# Altium footprint library TYCO THD.PcbLib: 146 footprints (part 4 of 11) (continued)
## TYCO_3-794630-8 [mm] "8 Circuits Dual-Row - Vertical Micro MATE-N-LOK Connector"
height 9.24
pads (8):
  round 1.8 hole 1.1: 1(4.5,-1.5) 2(1.5,-1.5) 3(-1.5,-1.5) 4(-4.5,-1.5) 5(4.5,1.5) 6(1.5,1.5) 7(-1.5,1.5) 8(-4.5,1.5)
Top Overlay:
  lines w0.2: -6.86,-1 -6.43,-1 ; -6.86,1 -6.43,1 ; -4.25,-3.43 cw(c-4.25,-3.63) -4.05,-3.63 -4.05,-3.94 -2.8,-3.94 -2.8,-3.63 cw(c-2.6,-3.63) -2.6,-3.43 ; -1.3,3.43 ccw(c-1.3,4.03) -0.7,4.03 -0.7,4.082 ; 1.3,3.43 cw(c1.3,4.03) 0.7,4.03 0.7,4.082 ; 2.6,-3.43 cw(c2.6,-3.63) 2.8,-3.63 2.8,-3.94 4.05,-3.94 4.05,-3.63 cw(c4.25,-3.63) 4.25,-3.43 ; 6.43,-1 6.86,-1 ; 6.43,1 6.86,1 ; -7.55,-1.5 -6.86,-1.5 -6.86,1.5 -7.55,1.5 ; -7.55,-1.5 -8,-0.72 -8,0.72 -7.55,1.5 ; -7.55,-1.5 -7.55,1.5 ; -0.7,4.082 -0.7,4.73 0.7,4.73 0.7,4.082 ; -0.7,4.082 0.7,4.082 ; 7.55,-1.5 6.86,-1.5 6.86,1.5 7.55,1.5 ; 7.55,-1.5 7.55,1.5 ; 7.55,-1.5 8,-0.72 8,0.72 7.55,1.5 ; -6.43,-3.43 -6.43,3.43 6.43,3.43 6.43,-3.43 -6.43,-3.43 ; -5.81,-2.81 -3.89,-2.81 -3.19,-2.11 -3.19,-0.19 -5.81,-0.19 -5.81,-2.81 ; -5.81,0.19 -3.19,0.19 -3.19,2.81 -5.81,2.81 -5.81,0.19 ; -2.81,-2.11 -2.81,-0.19 -0.19,-0.19 -0.19,-2.81 -2.11,-2.81 -2.81,-2.11 ; -2.81,0.89 -2.81,2.81 -0.19,2.81 -0.19,0.19 -2.11,0.19 -2.81,0.89 ; 0.19,-2.81 2.11,-2.81 2.81,-2.11 2.81,-0.19 0.19,-0.19 0.19,-2.81 ; 0.19,0.19 2.11,0.19 2.81,0.89 2.81,2.81 0.19,2.81 0.19,0.19 ; 3.19,-2.11 3.19,-0.19 5.81,-0.19 5.81,-2.81 3.89,-2.81 3.19,-2.11 ; 3.19,0.89 3.19,2.81 5.81,2.81 5.81,0.19 3.89,0.19 3.19,0.89
  text "3" at -0.889,-4.87 h1.2
  text "2" at 2.032,-4.87 h1.2
  text "7" at -1.448,4.01 h1.2
  text "6" at 2.487,4.01 h1.2
  text "5" at 4.902,4.064 h1.2
  text "8" at -4.064,4.035 h1.2
  text "4" at -4.445,-4.87 h1.2
  text "1" at 5.588,-4.67 h1.2
Mechanical 8:
  lines w0.1: -5.5,-1.5 -4.5,-1.5 ; -5.5,1.5 -4.5,1.5 ; -4.5,-2.5 -4.5,-1.5 ; -4.5,-0.5 -4.5,-1.5 ; -4.5,0.5 -4.5,1.5 ; -4.5,2.5 -4.5,1.5 ; -3.5,-1.5 -4.5,-1.5 ; -3.5,1.5 -4.5,1.5 ; -2.5,-1.5 -1.5,-1.5 ; -2.5,1.5 -1.5,1.5 ; -1.5,-2.5 -1.5,-1.5 ; -1.5,-0.5 -1.5,-1.5 ; -1.5,0.5 -1.5,1.5 ; -1.5,2.5 -1.5,1.5 ; -1,0 0,0 ; -0.5,-1.5 -1.5,-1.5 ; -0.5,1.5 -1.5,1.5 ; 0,-1 0,0 ; 0,1 0,0 ; 0.5,-1.5 1.5,-1.5 ; 0.5,1.5 1.5,1.5 ; 1,0 0,0 ; 1.5,-2.5 1.5,-1.5 ; 1.5,-0.5 1.5,-1.5 ; 1.5,0.5 1.5,1.5 ; 1.5,2.5 1.5,1.5 ; 2.5,-1.5 1.5,-1.5 ; 2.5,1.5 1.5,1.5 ; 3.5,-1.5 4.5,-1.5 ; 3.5,1.5 4.5,1.5 ; 4.5,-2.5 4.5,-1.5 ; 4.5,-0.5 4.5,-1.5 ; 4.5,0.5 4.5,1.5 ; 4.5,2.5 4.5,1.5 ; 5.5,-1.5 4.5,-1.5 ; 5.5,1.5 4.5,1.5
Mechanical 14:
  lines w0.1: -6.86,-1 -6.43,-1 ; -6.86,1 -6.43,1 ; -4.25,-3.43 cw(c-4.25,-3.63) -4.05,-3.63 -4.05,-3.94 -2.8,-3.94 -2.8,-3.63 cw(c-2.6,-3.63) -2.6,-3.43 ; -1.3,3.43 ccw(c-1.3,4.03) -0.7,4.03 -0.7,4.082 ; 1.3,3.43 cw(c1.3,4.03) 0.7,4.03 0.7,4.082 ; 2.6,-3.43 cw(c2.6,-3.63) 2.8,-3.63 2.8,-3.94 4.05,-3.94 4.05,-3.63 cw(c4.25,-3.63) 4.25,-3.43 ; 6.43,-1 6.86,-1 ; 6.43,1 6.86,1 ; -7.55,-1.5 -6.86,-1.5 -6.86,1.5 -7.55,1.5 ; -7.55,-1.5 -8,-0.72 -8,0.72 -7.55,1.5 ; -7.55,-1.5 -7.55,1.5 ; -0.7,4.082 -0.7,4.73 0.7,4.73 0.7,4.082 ; -0.7,4.082 0.7,4.082 ; 7.55,-1.5 6.86,-1.5 6.86,1.5 7.55,1.5 ; 7.55,-1.5 7.55,1.5 ; 7.55,-1.5 8,-0.72 8,0.72 7.55,1.5 ; -6.43,-3.43 -6.43,3.43 6.43,3.43 6.43,-3.43 -6.43,-3.43 ; -5.81,-2.81 -3.89,-2.81 -3.19,-2.11 -3.19,-0.19 -5.81,-0.19 -5.81,-2.81 ; -5.81,0.19 -3.19,0.19 -3.19,2.81 -5.81,2.81 -5.81,0.19 ; -2.81,-2.11 -2.81,-0.19 -0.19,-0.19 -0.19,-2.81 -2.11,-2.81 -2.81,-2.11 ; -2.81,0.89 -2.81,2.81 -0.19,2.81 -0.19,0.19 -2.11,0.19 -2.81,0.89 ; 0.19,-2.81 2.11,-2.81 2.81,-2.11 2.81,-0.19 0.19,-0.19 0.19,-2.81 ; 0.19,0.19 2.11,0.19 2.81,0.89 2.81,2.81 0.19,2.81 0.19,0.19 ; 3.19,-2.11 3.19,-0.19 5.81,-0.19 5.81,-2.81 3.89,-2.81 3.19,-2.11 ; 3.19,0.89 3.19,2.81 5.81,2.81 5.81,0.19 3.89,0.19 3.19,0.89
  text "3" at -0.889,-4.87 h1.2
  text "2" at 2.032,-4.87 h1.2
  text "7" at -1.448,4.01 h1.2
  text "6" at 2.487,4.01 h1.2
  text "5" at 4.902,4.064 h1.2
  text "8" at -4.064,4.035 h1.2
  text "4" at -4.445,-4.87 h1.2
  text "1" at 5.588,-4.67 h1.2
3D body "TYCO_3-794630-8.stp": height 9.24, standoff -3.18, extent -8,-3.94 8,4.73

## TYCO_3-794631-4 [mm] "4 Circuits Dual-Row - Vertical Micro MATE-N-LOK Connector - Gold Contact Plating"
height 9.24
pads (4):
  round 1.8 hole 1.1: 1(1.5,-1.5) 2(-1.5,-1.5) 3(1.5,1.5) 4(-1.5,1.5)
Top Overlay:
  lines w0.2: -3.86,-1 -3.43,-1 ; -3.86,1 -3.43,1 ; -1.9,-3.43 cw(c-1.9,-3.63) -1.7,-3.63 -1.7,-3.94 -0.45,-3.94 -0.45,-3.63 cw(c-0.25,-3.63) -0.25,-3.43 ; -1.3,3.43 ccw(c-1.3,4.03) -0.7,4.03 -0.7,4.082 ; 0.25,-3.43 cw(c0.25,-3.63) 0.45,-3.63 0.45,-3.94 1.7,-3.94 1.7,-3.63 cw(c1.9,-3.63) 1.9,-3.43 ; 1.3,3.43 cw(c1.3,4.03) 0.7,4.03 0.7,4.082 ; 3.43,-1 3.86,-1 ; 3.43,1 3.86,1 ; -4.55,-1.5 -4.55,1.5 ; -4.55,-1.5 -5,-0.72 -5,0.72 -4.55,1.5 ; -4.55,-1.5 -3.86,-1.5 -3.86,1.5 -4.55,1.5 ; -0.7,4.082 0.7,4.082 ; -0.7,4.082 -0.7,4.73 0.7,4.73 0.7,4.082 ; 4.55,-1.5 5,-0.72 5,0.72 4.55,1.5 ; 4.55,-1.5 4.55,1.5 ; 4.55,-1.5 3.86,-1.5 3.86,1.5 4.55,1.5 ; -3.43,-3.43 3.43,-3.43 3.43,3.43 -3.43,3.43 -3.43,-3.43 ; -2.81,-2.11 -2.11,-2.81 -0.19,-2.81 -0.19,-0.19 -2.81,-0.19 -2.81,-2.11 ; -2.81,0.19 -2.81,2.81 -0.19,2.81 -0.19,0.89 -0.89,0.19 -2.81,0.19 ; 0.19,-2.81 0.19,-0.19 2.81,-0.19 2.81,-2.11 2.11,-2.81 0.19,-2.81 ; 0.19,0.89 0.89,0.19 2.81,0.19 2.81,2.81 0.19,2.81 0.19,0.89
  text "1" at 3.373,-4.345 h1.2
  text "2" at -2.157,-4.72 h1.2
  text "4" at -1.725,3.934 h1.2
  text "3" at 2.893,4.012 h1.2
Mechanical 8:
  lines w0.1: -2.5,-1.5 -1.5,-1.5 ; -2.5,1.5 -1.5,1.5 ; -1.5,-2.5 -1.5,-1.5 ; -1.5,-0.5 -1.5,-1.5 ; -1.5,0.5 -1.5,1.5 ; -1.5,2.5 -1.5,1.5 ; -1,0 0,0 ; -0.5,-1.5 -1.5,-1.5 ; -0.5,1.5 -1.5,1.5 ; 0,-1 0,0 ; 0,1 0,0 ; 0.5,-1.5 1.5,-1.5 ; 0.5,1.5 1.5,1.5 ; 1,0 0,0 ; 1.5,-2.5 1.5,-1.5 ; 1.5,-0.5 1.5,-1.5 ; 1.5,0.5 1.5,1.5 ; 1.5,2.5 1.5,1.5 ; 2.5,-1.5 1.5,-1.5 ; 2.5,1.5 1.5,1.5
Mechanical 14:
  lines w0.1: -3.86,-1 -3.43,-1 ; -3.86,1 -3.43,1 ; -1.9,-3.43 cw(c-1.9,-3.63) -1.7,-3.63 -1.7,-3.94 -0.45,-3.94 -0.45,-3.63 cw(c-0.25,-3.63) -0.25,-3.43 ; -1.3,3.43 ccw(c-1.3,4.03) -0.7,4.03 -0.7,4.082 ; 0.25,-3.43 cw(c0.25,-3.63) 0.45,-3.63 0.45,-3.94 1.7,-3.94 1.7,-3.63 cw(c1.9,-3.63) 1.9,-3.43 ; 1.3,3.43 cw(c1.3,4.03) 0.7,4.03 0.7,4.082 ; 3.43,-1 3.86,-1 ; 3.43,1 3.86,1 ; -4.55,-1.5 -4.55,1.5 ; -4.55,-1.5 -5,-0.72 -5,0.72 -4.55,1.5 ; -4.55,-1.5 -3.86,-1.5 -3.86,1.5 -4.55,1.5 ; -0.7,4.082 0.7,4.082 ; -0.7,4.082 -0.7,4.73 0.7,4.73 0.7,4.082 ; 4.55,-1.5 5,-0.72 5,0.72 4.55,1.5 ; 4.55,-1.5 4.55,1.5 ; 4.55,-1.5 3.86,-1.5 3.86,1.5 4.55,1.5 ; -3.43,-3.43 3.43,-3.43 3.43,3.43 -3.43,3.43 -3.43,-3.43 ; -2.81,-2.11 -2.11,-2.81 -0.19,-2.81 -0.19,-0.19 -2.81,-0.19 -2.81,-2.11 ; -2.81,0.19 -2.81,2.81 -0.19,2.81 -0.19,0.89 -0.89,0.19 -2.81,0.19 ; 0.19,-2.81 0.19,-0.19 2.81,-0.19 2.81,-2.11 2.11,-2.81 0.19,-2.81 ; 0.19,0.89 0.89,0.19 2.81,0.19 2.81,2.81 0.19,2.81 0.19,0.89
  text "1" at 3.373,-4.345 h1.2
  text "2" at -2.157,-4.72 h1.2
  text "4" at -1.725,3.934 h1.2
  text "3" at 2.893,4.012 h1.2
3D body "TYCO_3-794631-4.stp": height 9.24, standoff -3.18, extent -5,-3.94 5,4.73

## TYCO_3-794631-8 [mm] "8 Circuits Dual-Row - Vertical Micro MATE-N-LOK Connector - Gold Contact Plating"
height 9.24
pads (8):
  round 1.8 hole 1.1: 1(4.5,-1.5) 2(1.5,-1.5) 3(-1.5,-1.5) 4(-4.5,-1.5) 5(4.5,1.5) 6(1.5,1.5) 7(-1.5,1.5) 8(-4.5,1.5)
Top Overlay:
  lines w0.2: -6.86,-1 -6.43,-1 ; -6.86,1 -6.43,1 ; -4.25,-3.43 cw(c-4.25,-3.63) -4.05,-3.63 -4.05,-3.94 -2.8,-3.94 -2.8,-3.63 cw(c-2.6,-3.63) -2.6,-3.43 ; -1.3,3.43 ccw(c-1.3,4.03) -0.7,4.03 -0.7,4.082 ; 1.3,3.43 cw(c1.3,4.03) 0.7,4.03 0.7,4.082 ; 2.6,-3.43 cw(c2.6,-3.63) 2.8,-3.63 2.8,-3.94 4.05,-3.94 4.05,-3.63 cw(c4.25,-3.63) 4.25,-3.43 ; 6.43,-1 6.86,-1 ; 6.43,1 6.86,1 ; -7.55,-1.5 -7.55,1.5 ; -7.55,-1.5 -8,-0.72 -8,0.72 -7.55,1.5 ; -7.55,-1.5 -6.86,-1.5 -6.86,1.5 -7.55,1.5 ; -0.7,4.082 0.7,4.082 ; -0.7,4.082 -0.7,4.73 0.7,4.73 0.7,4.082 ; 7.55,-1.5 8,-0.72 8,0.72 7.55,1.5 ; 7.55,-1.5 7.55,1.5 ; 7.55,-1.5 6.86,-1.5 6.86,1.5 7.55,1.5 ; -6.43,-3.43 6.43,-3.43 6.43,3.43 -6.43,3.43 -6.43,-3.43 ; -5.81,-2.81 -5.81,-0.19 -3.19,-0.19 -3.19,-2.11 -3.89,-2.81 -5.81,-2.81 ; -5.81,0.19 -5.81,2.81 -3.19,2.81 -3.19,0.19 -5.81,0.19 ; -2.81,-2.11 -2.11,-2.81 -0.19,-2.81 -0.19,-0.19 -2.81,-0.19 -2.81,-2.11 ; -2.81,0.89 -2.11,0.19 -0.19,0.19 -0.19,2.81 -2.81,2.81 -2.81,0.89 ; 0.19,-2.81 0.19,-0.19 2.81,-0.19 2.81,-2.11 2.11,-2.81 0.19,-2.81 ; 0.19,0.19 0.19,2.81 2.81,2.81 2.81,0.89 2.11,0.19 0.19,0.19 ; 3.19,-2.11 3.89,-2.81 5.81,-2.81 5.81,-0.19 3.19,-0.19 3.19,-2.11 ; 3.19,0.89 3.89,0.19 5.81,0.19 5.81,2.81 3.19,2.81 3.19,0.89
  text "1" at 5.588,-4.67 h1.2
  text "4" at -4.445,-4.87 h1.2
  text "8" at -4.064,4.01 h1.2
  text "5" at 4.902,4.039 h1.2
  text "6" at 2.362,3.985 h1.2
  text "7" at -1.448,3.985 h1.2
  text "2" at 2.032,-4.87 h1.2
  text "3" at -0.889,-4.87 h1.2
Mechanical 8:
  lines w0.1: -5.5,-1.5 -4.5,-1.5 ; -5.5,1.5 -4.5,1.5 ; -4.5,-2.5 -4.5,-1.5 ; -4.5,-0.5 -4.5,-1.5 ; -4.5,0.5 -4.5,1.5 ; -4.5,2.5 -4.5,1.5 ; -3.5,-1.5 -4.5,-1.5 ; -3.5,1.5 -4.5,1.5 ; -2.5,-1.5 -1.5,-1.5 ; -2.5,1.5 -1.5,1.5 ; -1.5,-2.5 -1.5,-1.5 ; -1.5,-0.5 -1.5,-1.5 ; -1.5,0.5 -1.5,1.5 ; -1.5,2.5 -1.5,1.5 ; -1,0 0,0 ; -0.5,-1.5 -1.5,-1.5 ; -0.5,1.5 -1.5,1.5 ; 0,-1 0,0 ; 0,1 0,0 ; 0.5,-1.5 1.5,-1.5 ; 0.5,1.5 1.5,1.5 ; 1,0 0,0 ; 1.5,-2.5 1.5,-1.5 ; 1.5,-0.5 1.5,-1.5 ; 1.5,0.5 1.5,1.5 ; 1.5,2.5 1.5,1.5 ; 2.5,-1.5 1.5,-1.5 ; 2.5,1.5 1.5,1.5 ; 3.5,-1.5 4.5,-1.5 ; 3.5,1.5 4.5,1.5 ; 4.5,-2.5 4.5,-1.5 ; 4.5,-0.5 4.5,-1.5 ; 4.5,0.5 4.5,1.5 ; 4.5,2.5 4.5,1.5 ; 5.5,-1.5 4.5,-1.5 ; 5.5,1.5 4.5,1.5
Mechanical 14:
  lines w0.1: -6.86,-1 -6.43,-1 ; -6.86,1 -6.43,1 ; -4.25,-3.43 cw(c-4.25,-3.63) -4.05,-3.63 -4.05,-3.94 -2.8,-3.94 -2.8,-3.63 cw(c-2.6,-3.63) -2.6,-3.43 ; -1.3,3.43 ccw(c-1.3,4.03) -0.7,4.03 -0.7,4.082 ; 1.3,3.43 cw(c1.3,4.03) 0.7,4.03 0.7,4.082 ; 2.6,-3.43 cw(c2.6,-3.63) 2.8,-3.63 2.8,-3.94 4.05,-3.94 4.05,-3.63 cw(c4.25,-3.63) 4.25,-3.43 ; 6.43,-1 6.86,-1 ; 6.43,1 6.86,1 ; -7.55,-1.5 -7.55,1.5 ; -7.55,-1.5 -8,-0.72 -8,0.72 -7.55,1.5 ; -7.55,-1.5 -6.86,-1.5 -6.86,1.5 -7.55,1.5 ; -0.7,4.082 0.7,4.082 ; -0.7,4.082 -0.7,4.73 0.7,4.73 0.7,4.082 ; 7.55,-1.5 8,-0.72 8,0.72 7.55,1.5 ; 7.55,-1.5 7.55,1.5 ; 7.55,-1.5 6.86,-1.5 6.86,1.5 7.55,1.5 ; -6.43,-3.43 6.43,-3.43 6.43,3.43 -6.43,3.43 -6.43,-3.43 ; -5.81,-2.81 -5.81,-0.19 -3.19,-0.19 -3.19,-2.11 -3.89,-2.81 -5.81,-2.81 ; -5.81,0.19 -5.81,2.81 -3.19,2.81 -3.19,0.19 -5.81,0.19 ; -2.81,-2.11 -2.11,-2.81 -0.19,-2.81 -0.19,-0.19 -2.81,-0.19 -2.81,-2.11 ; -2.81,0.89 -2.11,0.19 -0.19,0.19 -0.19,2.81 -2.81,2.81 -2.81,0.89 ; 0.19,-2.81 0.19,-0.19 2.81,-0.19 2.81,-2.11 2.11,-2.81 0.19,-2.81 ; 0.19,0.19 0.19,2.81 2.81,2.81 2.81,0.89 2.11,0.19 0.19,0.19 ; 3.19,-2.11 3.89,-2.81 5.81,-2.81 5.81,-0.19 3.19,-0.19 3.19,-2.11 ; 3.19,0.89 3.89,0.19 5.81,0.19 5.81,2.81 3.19,2.81 3.19,0.89
  text "1" at 5.588,-4.67 h1.2
  text "4" at -4.445,-4.87 h1.2
  text "8" at -4.064,4.01 h1.2
  text "5" at 4.902,4.039 h1.2
  text "6" at 2.362,3.985 h1.2
  text "7" at -1.448,3.985 h1.2
  text "2" at 2.032,-4.87 h1.2
  text "3" at -0.889,-4.87 h1.2
3D body "TYCO_3-794631-8.stp": height 9.24, standoff -3.18, extent -8,-3.94 8,4.73

## TYCO_3-1634221-2 [mm] "Straight D-SUB 37 Male Contacts for PCB  with Harpoons and Female Screwlock (UNC4-40)"
height 12.6
pads (39):
  round 1.6 hole 1: 1(-24.93,1.42) 2(-22.16,1.42) 3(-19.39,1.42) 4(-16.62,1.42) 5(-13.85,1.42) 6(-11.08,1.42) 7(-8.31,1.42) 8(-5.54,1.42) 9(-2.77,1.42) 10(0,1.42) 11(2.77,1.42) 12(5.54,1.42) 13(8.31,1.42) 14(11.08,1.42) 15(13.85,1.42) 16(16.62,1.42) 17(19.39,1.42) 18(22.16,1.42) 19(24.93,1.42) 20(-23.545,-1.42) 21(-20.775,-1.42) 22(-18.005,-1.42) 23(-15.235,-1.42) 24(-12.465,-1.42) 25(-9.695,-1.42) 26(-6.925,-1.42) 27(-4.155,-1.42) 28(-1.385,-1.42) 29(1.385,-1.42) 30(4.155,-1.42) 31(6.925,-1.42) 32(9.695,-1.42) 33(12.465,-1.42) 34(15.235,-1.42) 35(18.005,-1.42) 36(20.775,-1.42) 37(23.545,-1.42)
  round 5.5 hole 3.1: 38(31.755,0) 39(-31.755,0)
Top Overlay:
  circle w0.5: c24.93,7.42 r0.25
  lines w0.2: -34.7,-4.675 ccw(c-33.1,-4.675) -33.1,-6.275 33.1,-6.275 ccw(c33.1,-4.675) 34.7,-4.675 34.7,4.675 ccw(c33.1,4.675) 33.1,6.275 -33.1,6.275 ccw(c-33.1,4.675) -34.7,4.675 -34.7,-4.675 ; -27.776,0.946 cw(c-24.92,1.45) -24.92,4.35 24.92,4.35 cw(c24.92,1.45) 27.776,0.946 27.265,-1.954 cw(c24.409,-1.45) 24.409,-4.35 -24.409,-4.35 cw(c-24.409,-1.45) -27.265,-1.954 -27.776,0.946 ; -27.382,1.016 cw(c-24.92,1.45) -24.92,3.95 24.92,3.95 cw(c24.92,1.45) 27.382,1.016 26.871,-1.884 cw(c24.409,-1.45) 24.409,-3.95 -24.409,-3.95 cw(c-24.409,-1.45) -26.871,-1.884 -27.382,1.016
  text "37" at 26.059,-5.715 h1.2
  text "20" at -28.27,-5.842 h1.2
  text "1" at -27,4.318 h1.2
  text "19" at 26.543,4.318 h1.2
Mechanical 8:
  drawing of 160 lines, arcs and shapes, not listed
Mechanical 14:
  circle w0.1: c-22.16,1.42 r0.5
  circle w0.1: c-19.39,1.42 r0.5
  circle w0.1: c-16.62,1.42 r0.5
  circle w0.1: c-15.235,-1.42 r0.5
  circle w0.1: c-11.08,1.42 r0.5
  circle w0.1: c-9.695,-1.42 r0.5
  circle w0.1: c-5.54,1.42 r0.5
  circle w0.1: c-2.77,1.42 r0.5
  circle w0.1: c0,1.42 r0.5
  circle w0.1: c1.385,-1.42 r0.5
  circle w0.1: c5.54,1.42 r0.5
  circle w0.1: c11.08,1.42 r0.5
  circle w0.1: c16.62,1.42 r0.5
  circle w0.1: c22.16,1.42 r0.5
  circle w0.1: c6.925,-1.42 r0.5
  circle w0.1: c12.465,-1.42 r0.5
  circle w0.1: c18.005,-1.42 r0.5
  circle w0.1: c23.545,-1.42 r0.5
  circle w0.1: c20.775,-1.42 r0.5
  circle w0.1: c15.235,-1.42 r0.5
  circle w0.1: c9.695,-1.42 r0.5
  circle w0.1: c4.155,-1.42 r0.5
  circle w0.1: c19.39,1.42 r0.5
  circle w0.1: c13.85,1.42 r0.5
  circle w0.1: c8.31,1.42 r0.5
  circle w0.1: c2.77,1.42 r0.5
  circle w0.1: c-1.385,-1.42 r0.5
  circle w0.1: c-4.155,-1.42 r0.5
  circle w0.1: c-6.925,-1.42 r0.5
  circle w0.1: c-8.31,1.42 r0.5
  circle w0.1: c-12.465,-1.42 r0.5
  circle w0.1: c-13.85,1.42 r0.5
  circle w0.1: c-18.005,-1.42 r0.5
  circle w0.1: c-20.775,-1.42 r0.5
  circle w0.1: c-23.545,-1.42 r0.5
  circle w0.1: c-24.93,1.42 r0.5
  circle w0.1: c24.93,1.42 r0.5
  circle w0.1: c-31.755,0 r1.422
  circle w0.1: c31.755,0 r1.422
  lines w0.1: -34.7,-4.675 ccw(c-33.1,-4.675) -33.1,-6.275 33.1,-6.275 ccw(c33.1,-4.675) 34.7,-4.675 34.7,4.675 ccw(c33.1,4.675) 33.1,6.275 -33.1,6.275 ccw(c-33.1,4.675) -34.7,4.675 -34.7,-4.675 ; -34.497,0 -33.126,2.375 -30.384,2.375 -29.013,0 -30.384,-2.375 -33.126,-2.375 -34.497,0 ; -27.776,0.946 cw(c-24.92,1.45) -24.92,4.35 24.92,4.35 cw(c24.92,1.45) 27.776,0.946 27.265,-1.954 cw(c24.409,-1.45) 24.409,-4.35 -24.409,-4.35 cw(c-24.409,-1.45) -27.265,-1.954 -27.776,0.946 ; -27.382,1.016 cw(c-24.92,1.45) -24.92,3.95 24.92,3.95 cw(c24.92,1.45) 27.382,1.016 26.871,-1.884 cw(c24.409,-1.45) 24.409,-3.95 -24.409,-3.95 cw(c-24.409,-1.45) -26.871,-1.884 -27.382,1.016 ; 29.013,0 30.384,2.375 33.126,2.375 34.497,0 33.126,-2.375 30.384,-2.375 29.013,0
  text "37 D-Sub Male" at -8.128,4.572 h1.5
  text "37" at 26.059,-5.715 h1.5
  text "20" at -28.27,-5.842 h1.5
  text "1" at -27,4.318 h1.5
  text "19" at 26.543,4.318 h1.5
3D body "TYCO_3-1634221-2.stp": height 12.6, standoff -4.5, extent -34.7,-6.275 34.7,6.275

## TYCO_3-1634225-2 [mm] "Straight D-SUB 37 Female Contacts for PCB  with Harpoons and Female Screwlock (UNC4-40)"
height 12.15
pads (39):
  round 1.6 hole 1: 1(24.93,1.42) 2(22.16,1.42) 3(19.39,1.42) 4(16.62,1.42) 5(13.85,1.42) 6(11.08,1.42) 7(8.31,1.42) 8(5.54,1.42) 9(2.77,1.42) 10(0,1.42) 11(-2.77,1.42) 12(-5.54,1.42) 13(-8.31,1.42) 14(-11.08,1.42) 15(-13.85,1.42) 16(-16.62,1.42) 17(-19.39,1.42) 18(-22.16,1.42) 19(-24.93,1.42) 20(23.545,-1.42) 21(20.775,-1.42) 22(18.005,-1.42) 23(15.235,-1.42) 24(12.465,-1.42) 25(9.695,-1.42) 26(6.925,-1.42) 27(4.155,-1.42) 28(1.385,-1.42) 29(-1.385,-1.42) 30(-4.155,-1.42) 31(-6.925,-1.42) 32(-9.695,-1.42) 33(-12.465,-1.42) 34(-15.235,-1.42) 35(-18.005,-1.42) 36(-20.775,-1.42) 37(-23.545,-1.42)
  round 5.5 hole 3.1: 38(31.755,0) 39(-31.755,0)
Top Overlay:
  circle w0.5: c24.93,7.42 r0.25
  lines w0.2: -34.7,-3.6 -34.7,-4.675 ccw(c-33.1,-4.675) -33.1,-6.275 33.1,-6.275 ccw(c33.1,-4.675) 34.7,-4.675 34.7,-3.6 ; -34.7,3.4 -34.7,4.675 cw(c-33.1,4.675) -33.1,6.275 33.1,6.275 cw(c33.1,4.675) 34.7,4.675 34.7,3.4 ; -27.382,1.016 cw(c-24.92,1.45) -24.92,3.95 24.92,3.95 cw(c24.92,1.45) 27.382,1.016 26.871,-1.884 cw(c24.409,-1.45) 24.409,-3.95 -24.409,-3.95 cw(c-24.409,-1.45) -26.871,-1.884 -27.382,1.016 ; -26.988,1.085 cw(c-24.92,1.45) -24.92,3.55 24.92,3.55 cw(c24.92,1.45) 26.988,1.085 26.477,-1.815 cw(c24.409,-1.45) 24.409,-3.55 -24.409,-3.55 cw(c-24.409,-1.45) -26.477,-1.815 -26.988,1.085
  text "1" at 24.765,4.445 h1.2
  text "19" at -25.984,4.445 h1.2
  text "37" at -24.841,-5.842 h1.2
  text "20" at 22.249,-5.842 h1.2
Mechanical 8:
  drawing of 160 lines, arcs and shapes, not listed
Mechanical 14:
  circle w0.1: c31.755,0 r1.422
  circle w0.1: c-31.755,0 r1.422
  circle w0.1: c24.93,1.42 r0.5
  circle w0.1: c-24.93,1.42 r0.5
  circle w0.1: c-23.545,-1.42 r0.5
  circle w0.1: c-20.775,-1.42 r0.5
  circle w0.1: c-18.005,-1.42 r0.5
  circle w0.1: c-13.85,1.42 r0.5
  circle w0.1: c-12.465,-1.42 r0.5
  circle w0.1: c-8.31,1.42 r0.5
  circle w0.1: c-6.925,-1.42 r0.5
  circle w0.1: c-4.155,-1.42 r0.5
  circle w0.1: c-1.385,-1.42 r0.5
  circle w0.1: c2.77,1.42 r0.5
  circle w0.1: c8.31,1.42 r0.5
  circle w0.1: c13.85,1.42 r0.5
  circle w0.1: c19.39,1.42 r0.5
  circle w0.1: c4.155,-1.42 r0.5
  circle w0.1: c9.695,-1.42 r0.5
  circle w0.1: c15.235,-1.42 r0.5
  circle w0.1: c20.775,-1.42 r0.5
  circle w0.1: c23.545,-1.42 r0.5
  circle w0.1: c18.005,-1.42 r0.5
  circle w0.1: c12.465,-1.42 r0.5
  circle w0.1: c6.925,-1.42 r0.5
  circle w0.1: c22.16,1.42 r0.5
  circle w0.1: c16.62,1.42 r0.5
  circle w0.1: c11.08,1.42 r0.5
  circle w0.1: c5.54,1.42 r0.5
  circle w0.1: c1.385,-1.42 r0.5
  circle w0.1: c0,1.42 r0.5
  circle w0.1: c-2.77,1.42 r0.5
  circle w0.1: c-5.54,1.42 r0.5
  circle w0.1: c-9.695,-1.42 r0.5
  circle w0.1: c-11.08,1.42 r0.5
  circle w0.1: c-15.235,-1.42 r0.5
  circle w0.1: c-16.62,1.42 r0.5
  circle w0.1: c-19.39,1.42 r0.5
  circle w0.1: c-22.16,1.42 r0.5
  lines w0.1: -34.7,-4.675 ccw(c-33.1,-4.675) -33.1,-6.275 33.1,-6.275 ccw(c33.1,-4.675) 34.7,-4.675 34.7,4.675 ccw(c33.1,4.675) 33.1,6.275 -33.1,6.275 ccw(c-33.1,4.675) -34.7,4.675 -34.7,-4.675 ; -34.497,0 -33.126,-2.375 -30.384,-2.375 -29.013,0 -30.384,2.375 -33.126,2.375 -34.497,0 ; -27.382,1.016 cw(c-24.92,1.45) -24.92,3.95 24.92,3.95 cw(c24.92,1.45) 27.382,1.016 26.871,-1.884 cw(c24.409,-1.45) 24.409,-3.95 -24.409,-3.95 cw(c-24.409,-1.45) -26.871,-1.884 -27.382,1.016 ; -26.988,1.085 cw(c-24.92,1.45) -24.92,3.55 24.92,3.55 cw(c24.92,1.45) 26.988,1.085 26.477,-1.815 cw(c24.409,-1.45) 24.409,-3.55 -24.409,-3.55 cw(c-24.409,-1.45) -26.477,-1.815 -26.988,1.085 ; 29.013,0 30.384,-2.375 33.126,-2.375 34.497,0 33.126,2.375 30.384,2.375 29.013,0
  text "1" at 24.765,4.445 h1.5
  text "19" at -25.984,4.445 h1.5
  text "37" at -24.841,-5.842 h1.5
  text "20" at 22.249,-5.842 h1.5
  text "37 D-Sub Female" at -9.525,4.318 h1.5
3D body "TYCO_3-1634225-2.stp": height 12.5, standoff -4.5, extent -34.7,-6.275 34.7,6.275

## TYCO_3-1634582-2 [mm] "Right Angle 25 Male Contacts D-SUB Connector With Boardlock and 4-40 UNC Screwlocks"
height 13.575
pads (27):
  round 1.7 hole 1: 1(16.62,-1.27) 2(13.85,-1.27) 3(11.08,-1.27) 4(8.31,-1.27) 5(5.54,-1.27) 6(2.77,-1.27) 7(0,-1.27) 8(-2.77,-1.27) 9(-5.54,-1.27) 10(-8.31,-1.27) 11(-11.08,-1.27) 12(-13.85,-1.27) 13(-16.62,-1.27) 14(15.235,1.27) 15(12.465,1.27) 16(9.695,1.27) 17(6.925,1.27) 18(4.155,1.27) 19(1.385,1.27) 20(-1.385,1.27) 21(-4.155,1.27) 22(-6.925,1.27) 23(-9.695,1.27) 24(-12.465,1.27) 25(-15.235,1.27)
  round 3.9 hole 3.2: 26(-23.52,0) 27(23.52,0)
Top Overlay:
  circle w0.5: c16.495,-4.305 r0.25
  lines w0.2: -26.567,2.62 -24.927,2.62 ; -26.567,7.21 -19.772,7.21 ; -26.567,7.85 26.533,7.85 ; -26.567,11.23 26.533,11.23 ; -26.525,9.2 26.533,9.2 ; -26.187,11.7 -26.187,17.2 -25.887,17.5 -21.187,17.5 -20.889,17.2 ; -26.184,17.2 cw(c-25.495,16.568) -25.572,17.5 cw(c-25.649,16.568) -24.959,17.2 -24.761,17.2 cw(c-23.537,14.767) -22.312,17.2 -22.114,17.2 cw(c-21.424,16.568) -21.501,17.5 cw(c-21.579,16.568) -20.889,17.2 ; -26.037,7.21 -26.037,6.96 -21.037,6.96 -21.037,7.21 ; -25.569,-1.15 -26.567,-1.15 -26.567,11.7 26.533,11.7 26.533,-1.15 25.569,-1.15 ; -24.877,6.96 -24.877,4.8 ; -24.862,11.7 -24.862,17.2 ; -22.212,11.7 -22.212,17.2 ; -22.197,6.96 -22.197,4.8 ; -22.147,2.62 -20.507,2.62 -20.507,7.21 ; -21.777,-1.576 -21.777,-3.08 21.743,-3.08 21.743,-1.538 ; -20.889,11.7 -20.889,17.2 ; -19.894,11.7 -19.894,17.2 cw(c-19.294,17.2) -19.294,17.8 19.263,17.8 cw(c19.263,17.2) 19.863,17.2 19.863,11.7 ; -19.772,-3.08 -19.772,7.85 ; 19.738,-3.08 19.738,7.85 ; 19.738,7.21 26.533,7.21 ; 20.473,7.21 20.473,2.62 22.113,2.62 ; 20.913,11.7 20.913,17.209 21.213,17.509 25.913,17.509 26.211,17.209 ; 20.916,17.209 cw(c21.605,16.577) 21.528,17.509 cw(c21.451,16.577) 22.141,17.209 22.339,17.209 cw(c23.563,14.777) 24.788,17.209 24.986,17.209 cw(c25.676,16.577) 25.599,17.509 cw(c25.522,16.577) 26.211,17.209 ; 21.003,7.21 21.003,6.96 26.003,6.96 26.003,7.21 ; 22.223,6.96 22.223,4.8 ; 22.238,11.7 22.238,17.209 ; 24.888,11.7 24.888,17.209 ; 24.893,2.62 26.533,2.62 ; 24.903,6.96 24.903,4.8 ; 26.211,11.7 26.211,17.209 ; -24.877,4.8 -22.197,4.8 ; -24.877,4.8 -24.577,4.5 -22.497,4.5 -22.197,4.8 ; 22.223,4.8 24.903,4.8 ; 22.223,4.8 22.523,4.5 24.603,4.5 24.903,4.8
  text "1" at 18.425,-1.77 h1.2
  text "25" at -18.86,0.72 h1.2
  text "14" at 17.04,0.77 h1.2
Mechanical 8:
  lines w0.1: -24.02,0 -23.52,0 ; -23.52,-0.5 -23.52,0 ; -23.52,0.5 -23.52,0 ; -23.02,0 -23.52,0 ; -17.12,-1.27 -16.62,-1.27 ; -16.62,-1.77 -16.62,-1.27 ; -16.62,-0.77 -16.62,-1.27 ; -16.12,-1.27 -16.62,-1.27 ; -15.735,1.27 -15.235,1.27 ; -15.235,0.77 -15.235,1.27 ; -15.235,1.77 -15.235,1.27 ; -14.735,1.27 -15.235,1.27 ; -14.35,-1.27 -13.85,-1.27 ; -13.85,-1.77 -13.85,-1.27 ; -13.85,-0.77 -13.85,-1.27 ; -13.35,-1.27 -13.85,-1.27 ; -12.965,1.27 -12.465,1.27 ; -12.465,0.77 -12.465,1.27 ; -12.465,1.77 -12.465,1.27 ; -11.965,1.27 -12.465,1.27 ; -11.58,-1.27 -11.08,-1.27 ; -11.08,-1.77 -11.08,-1.27 ; -11.08,-0.77 -11.08,-1.27 ; -10.58,-1.27 -11.08,-1.27 ; -10.195,1.27 -9.695,1.27 ; -9.695,0.77 -9.695,1.27 ; -9.695,1.77 -9.695,1.27 ; -9.195,1.27 -9.695,1.27 ; -8.81,-1.27 -8.31,-1.27 ; -8.31,-1.77 -8.31,-1.27 ; -8.31,-0.77 -8.31,-1.27 ; -7.81,-1.27 -8.31,-1.27 ; -7.425,1.27 -6.925,1.27 ; -6.925,0.77 -6.925,1.27 ; -6.925,1.77 -6.925,1.27 ; -6.425,1.27 -6.925,1.27 ; -6.04,-1.27 -5.54,-1.27 ; -5.54,-1.77 -5.54,-1.27 ; -5.54,-0.77 -5.54,-1.27 ; -5.04,-1.27 -5.54,-1.27 ; -4.655,1.27 -4.155,1.27 ; -4.155,0.77 -4.155,1.27 ; -4.155,1.77 -4.155,1.27 ; -3.655,1.27 -4.155,1.27 ; -3.27,-1.27 -2.77,-1.27 ; -2.77,-1.77 -2.77,-1.27 ; -2.77,-0.77 -2.77,-1.27 ; -2.27,-1.27 -2.77,-1.27 ; -1.885,1.27 -1.385,1.27 ; -1.385,0.77 -1.385,1.27 ; -1.385,1.77 -1.385,1.27 ; -0.885,1.27 -1.385,1.27 ; -0.5,-1.27 0,-1.27 ; -0.354,-0.354 0,0 ; -0.354,0.354 0,0 ; 0,-1.77 0,-1.27 ; 0,-0.77 0,-1.27 ; 0.354,-0.354 0,0 ; 0.354,0.354 0,0 ; 0.5,-1.27 0,-1.27 ; 0.885,1.27 1.385,1.27 ; 1.385,0.77 1.385,1.27 ; 1.385,1.77 1.385,1.27 ; 1.885,1.27 1.385,1.27 ; 2.27,-1.27 2.77,-1.27 ; 2.77,-1.77 2.77,-1.27 ; 2.77,-0.77 2.77,-1.27 ; 3.27,-1.27 2.77,-1.27 ; 3.655,1.27 4.155,1.27 ; 4.155,0.77 4.155,1.27 ; 4.155,1.77 4.155,1.27 ; 4.655,1.27 4.155,1.27 ; 5.04,-1.27 5.54,-1.27 ; 5.54,-1.77 5.54,-1.27 ; 5.54,-0.77 5.54,-1.27 ; 6.04,-1.27 5.54,-1.27 ; 6.425,1.27 6.925,1.27 ; 6.925,0.77 6.925,1.27 ; 6.925,1.77 6.925,1.27 ; 7.425,1.27 6.925,1.27 ; 7.81,-1.27 8.31,-1.27 ; 8.31,-1.77 8.31,-1.27 ; 8.31,-0.77 8.31,-1.27 ; 8.81,-1.27 8.31,-1.27 ; 9.195,1.27 9.695,1.27 ; 9.695,0.77 9.695,1.27 ; 9.695,1.77 9.695,1.27 ; 10.195,1.27 9.695,1.27 ; 10.58,-1.27 11.08,-1.27 ; 11.08,-1.77 11.08,-1.27 ; 11.08,-0.77 11.08,-1.27 ; 11.58,-1.27 11.08,-1.27 ; 11.965,1.27 12.465,1.27 ; 12.465,0.77 12.465,1.27 ; 12.465,1.77 12.465,1.27 ; 12.965,1.27 12.465,1.27 ; 13.35,-1.27 13.85,-1.27 ; 13.85,-1.77 13.85,-1.27 ; 13.85,-0.77 13.85,-1.27 ; 14.35,-1.27 13.85,-1.27 ; 14.735,1.27 15.235,1.27 ; 15.235,0.77 15.235,1.27 ; 15.235,1.77 15.235,1.27 ; 15.735,1.27 15.235,1.27 ; 16.12,-1.27 16.62,-1.27 ; 16.62,-1.77 16.62,-1.27 ; 16.62,-0.77 16.62,-1.27 ; 17.12,-1.27 16.62,-1.27 ; 23.02,0 23.52,0 ; 23.52,-0.5 23.52,0 ; 23.52,0.5 23.52,0 ; 24.02,0 23.52,0
Mechanical 14:
  lines w0.1: -26.567,2.62 -24.927,2.62 -24.927,-0.32 -23.987,-0.32 -23.987,2.17 cw(c-23.537,2.17) -23.087,2.17 -23.087,-0.32 -22.147,-0.32 -22.147,2.62 -20.507,2.62 -20.507,7.21 ; -26.567,7.21 -19.772,7.21 ; -26.567,7.85 26.533,7.85 ; -26.567,11.23 26.533,11.23 ; -26.525,9.2 26.533,9.2 ; -26.187,11.7 -26.187,17.2 -25.887,17.5 -21.187,17.5 -20.889,17.2 ; -26.184,17.2 cw(c-25.495,16.568) -25.572,17.5 cw(c-25.649,16.568) -24.959,17.2 -24.761,17.2 cw(c-23.537,14.767) -22.312,17.2 -22.114,17.2 cw(c-21.424,16.568) -21.501,17.5 cw(c-21.579,16.568) -20.889,17.2 ; -26.037,7.21 -26.037,6.96 -21.037,6.96 -21.037,7.21 ; -24.927,2.6 ccw(c-23.537,1.52) -25.297,1.52 -25.297,-1.15 -26.567,-1.15 -26.567,11.7 26.533,11.7 26.533,-1.15 25.263,-1.15 25.263,1.52 ccw(c23.503,1.52) 24.893,2.6 ; -24.877,6.96 -24.877,4.8 ; -24.862,11.7 -24.862,17.2 ; -22.212,11.7 -22.212,17.2 ; -22.197,6.96 -22.197,4.8 ; -22.147,2.6 cw(c-23.537,1.52) -21.777,1.52 -21.777,-3.08 21.743,-3.08 21.743,1.52 cw(c23.503,1.52) 22.113,2.6 ; -20.889,11.7 -20.889,17.2 ; -19.894,11.7 -19.894,17.2 cw(c-19.294,17.2) -19.294,17.8 19.263,17.8 cw(c19.263,17.2) 19.863,17.2 19.863,11.7 ; -19.772,-3.08 -19.772,7.85 ; 19.738,-3.08 19.738,7.85 ; 19.738,7.21 26.533,7.21 ; 20.473,7.21 20.473,2.62 22.113,2.62 22.113,-0.318 23.053,-0.32 23.053,2.17 cw(c23.503,2.17) 23.953,2.17 23.953,-0.32 24.893,-0.32 24.893,2.62 26.533,2.62 ; 20.913,11.7 20.913,17.209 21.213,17.509 25.913,17.509 26.211,17.209 ; 20.916,17.209 cw(c21.605,16.577) 21.528,17.509 cw(c21.451,16.577) 22.141,17.209 22.339,17.209 cw(c23.563,14.777) 24.788,17.209 24.986,17.209 cw(c25.676,16.577) 25.599,17.509 cw(c25.522,16.577) 26.211,17.209 ; 21.003,7.21 21.003,6.96 26.003,6.96 26.003,7.21 ; 22.223,6.96 22.223,4.8 ; 22.238,11.7 22.238,17.209 ; 24.888,11.7 24.888,17.209 ; 24.903,6.96 24.903,4.8 ; 26.211,11.7 26.211,17.209 ; -24.877,4.8 -22.197,4.8 ; -24.877,4.8 -24.577,4.5 -22.497,4.5 -22.197,4.8 ; 22.223,4.8 24.903,4.8 ; 22.223,4.8 22.523,4.5 24.603,4.5 24.903,4.8
  text "1" at 18.425,-1.77 h1.2
  text "25" at -18.86,0.72 h1.2
  text "14" at 17.04,0.77 h1.2
3D body "TYCO_3-1634582-2.stp": height 13.57, standoff -3.8, extent -26.567,-3.08 26.533,17.8